# Altium footprint library 6-Connectors-4.PcbLib: 166 footprints (part 8 of 12) (continued)
## SAMTEC_MTLW-105-07-L-D-250 [mm] "10 Contacts - Pitch 2.54mm - Dual Row Through Mount Straight Header (Post Lead = 6.35mm, Tail Lead 3.05mm, Insulator 1.52mm)"
height 7.87
pads (10):
  round 1.7 hole 1: 1(-5.08,-1.27) 2(-5.08,1.27) 3(-2.54,-1.27) 4(-2.54,1.27) 5(0,-1.27) 6(0,1.27) 7(2.54,-1.27) 8(2.54,1.27) 9(5.08,-1.27) 10(5.08,1.27)
Top Overlay:
  circle w0.3: c-5.045,-3.135 r0.15
  lines w0.2: -6.35,-2.007 -6.096,-2.515 -4.064,-2.515 -3.81,-2.007 -3.556,-2.515 -1.524,-2.515 -1.27,-2.007 -1.016,-2.515 1.016,-2.515 1.27,-2.007 1.524,-2.515 3.556,-2.515 3.81,-2.007 4.064,-2.515 6.096,-2.515 6.35,-2.007 6.35,2.007 6.096,2.515 4.064,2.515 3.81,2.007 3.556,2.515 1.524,2.515 1.27,2.007 1.016,2.515 -1.016,2.515 -1.27,2.007 -1.524,2.515 -3.556,2.515 -3.81,2.007 -4.064,2.515 -6.096,2.515 -6.35,2.007 -6.35,-2.007
  text "1" at -7.327,-1.768 h1
Mechanical 8:
  lines w0.1: -5.58,-1.27 -5.08,-1.27 ; -5.58,1.27 -5.08,1.27 ; -5.08,-1.77 -5.08,-1.27 ; -5.08,-0.77 -5.08,-1.27 ; -5.08,0.77 -5.08,1.27 ; -5.08,1.77 -5.08,1.27 ; -4.58,-1.27 -5.08,-1.27 ; -4.58,1.27 -5.08,1.27 ; -3.04,-1.27 -2.54,-1.27 ; -3.04,1.27 -2.54,1.27 ; -2.54,-1.77 -2.54,-1.27 ; -2.54,-0.77 -2.54,-1.27 ; -2.54,0.77 -2.54,1.27 ; -2.54,1.77 -2.54,1.27 ; -2.04,-1.27 -2.54,-1.27 ; -2.04,1.27 -2.54,1.27 ; -0.5,-1.27 0,-1.27 ; -0.5,0 0,0 ; -0.5,1.27 0,1.27 ; 0,-1.77 0,-1.27 ; 0,-0.77 0,-1.27 ; 0,-0.5 0,0 ; 0,0.5 0,0 ; 0,0.77 0,1.27 ; 0,1.77 0,1.27 ; 0.5,-1.27 0,-1.27 ; 0.5,0 0,0 ; 0.5,1.27 0,1.27 ; 2.04,-1.27 2.54,-1.27 ; 2.04,1.27 2.54,1.27 ; 2.54,-1.77 2.54,-1.27 ; 2.54,-0.77 2.54,-1.27 ; 2.54,0.77 2.54,1.27 ; 2.54,1.77 2.54,1.27 ; 3.04,-1.27 2.54,-1.27 ; 3.04,1.27 2.54,1.27 ; 4.58,-1.27 5.08,-1.27 ; 4.58,1.27 5.08,1.27 ; 5.08,-1.77 5.08,-1.27 ; 5.08,-0.77 5.08,-1.27 ; 5.08,0.77 5.08,1.27 ; 5.08,1.77 5.08,1.27 ; 5.58,-1.27 5.08,-1.27 ; 5.58,1.27 5.08,1.27
Mechanical 14:
  circle w0.3: c-5.045,-3.135 r0.15
  lines w0.1: -6.35,-2.007 -6.096,-2.515 -4.064,-2.515 -3.81,-2.007 -3.556,-2.515 -1.524,-2.515 -1.27,-2.007 -1.016,-2.515 1.016,-2.515 1.27,-2.007 1.524,-2.515 3.556,-2.515 3.81,-2.007 4.064,-2.515 6.096,-2.515 6.35,-2.007 6.35,2.007 6.096,2.515 4.064,2.515 3.81,2.007 3.556,2.515 1.524,2.515 1.27,2.007 1.016,2.515 -1.016,2.515 -1.27,2.007 -1.524,2.515 -3.556,2.515 -3.81,2.007 -4.064,2.515 -6.096,2.515 -6.35,2.007 -6.35,-2.007 ; -5.397,-1.587 -4.762,-1.587 -4.762,-0.953 -5.397,-0.953 -5.397,-1.587 ; -5.397,0.953 -4.762,0.953 -4.762,1.587 -5.397,1.587 -5.397,0.953 ; -2.857,-1.587 -2.222,-1.587 -2.222,-0.953 -2.857,-0.953 -2.857,-1.587 ; -2.857,0.953 -2.222,0.953 -2.222,1.587 -2.857,1.587 -2.857,0.953 ; -0.317,-1.587 0.318,-1.587 0.318,-0.953 -0.317,-0.953 -0.317,-1.587 ; -0.317,0.953 0.318,0.953 0.318,1.587 -0.317,1.587 -0.317,0.953 ; 2.223,-1.587 2.858,-1.587 2.858,-0.953 2.223,-0.953 2.223,-1.587 ; 2.223,0.953 2.858,0.953 2.858,1.587 2.223,1.587 2.223,0.953 ; 4.763,-1.587 5.398,-1.587 5.398,-0.953 4.763,-0.953 4.763,-1.587 ; 4.763,0.953 5.398,0.953 5.398,1.587 4.763,1.587 4.763,0.953
  text "1" at -7.327,-1.768 h1
3D body "SAMTEC_MTLW-105-07-L-D-250.stp": height 7.87, standoff -3.05, extent -6.35,-2.515 6.35,2.515

## SAMTEC_MTLW-110-07-L-D-250 [mm] "20 Contacts - Pitch 2.54mm - Dual Row Through Mount Straight Header (Post Lead = 6.35mm, Tail Lead 3.05mm, Insulator 1.52mm)"
height 7.87
pads (20):
  round 1.7 hole 1: 1(-11.43,-1.27) 2(-11.43,1.27) 3(-8.89,-1.27) 4(-8.89,1.27) 5(-6.35,-1.27) 6(-6.35,1.27) 7(-3.81,-1.27) 8(-3.81,1.27) 9(-1.27,-1.27) 10(-1.27,1.27) 11(1.27,-1.27) 12(1.27,1.27) 13(3.81,-1.27) 14(3.81,1.27) 15(6.35,-1.27) 16(6.35,1.27) 17(8.89,-1.27) 18(8.89,1.27) 19(11.43,-1.27) 20(11.43,1.27)
Top Overlay:
  circle w0.3: c-11.395,-3.135 r0.15
  lines w0.2: -10.16,-2.007 -10.414,-2.515 -12.446,-2.515 -12.7,-2.007 -12.7,2.007 -12.446,2.515 -10.414,2.515 -10.16,2.007 ; -10.16,-2.007 -10.16,2.007 ; -10.16,-2.007 -10.16,2.007 ; -10.16,-2.007 -9.906,-2.515 -7.874,-2.515 -7.62,-2.007 ; -10.16,2.007 -9.906,2.515 -7.874,2.515 -7.62,2.007 ; -7.62,-2.007 -7.62,2.007 ; -7.62,-2.007 -7.62,2.007 ; -7.62,-2.007 -7.366,-2.515 -5.334,-2.515 -5.08,-2.007 ; -7.62,2.007 -7.366,2.515 -5.334,2.515 -5.08,2.007 ; -5.08,-2.007 -5.08,2.007 ; -5.08,-2.007 -4.826,-2.515 -2.794,-2.515 -2.54,-2.007 ; -5.08,-2.007 -5.08,2.007 ; -5.08,2.007 -4.826,2.515 -2.794,2.515 -2.54,2.007 ; -2.54,-2.007 -2.54,2.007 ; -2.54,-2.007 -2.286,-2.515 -0.254,-2.515 0,-2.007 ; -2.54,-2.007 -2.54,2.007 ; -2.54,2.007 -2.286,2.515 -0.254,2.515 0,2.007 ; 0,-2.007 0,2.007 ; 0,-2.007 0.254,-2.515 2.286,-2.515 2.54,-2.007 ; 0,-2.007 0,2.007 ; 0,2.007 0.254,2.515 2.286,2.515 2.54,2.007 ; 2.54,-2.007 2.54,2.007 ; 2.54,-2.007 2.54,2.007 ; 2.54,-2.007 2.794,-2.515 4.826,-2.515 5.08,-2.007 ; 2.54,2.007 2.794,2.515 4.826,2.515 5.08,2.007 ; 5.08,-2.007 5.08,2.007 ; 5.08,-2.007 5.08,2.007 ; 5.08,-2.007 5.334,-2.515 7.366,-2.515 7.62,-2.007 ; 5.08,2.007 5.334,2.515 7.366,2.515 7.62,2.007 ; 7.62,-2.007 7.62,2.007 ; 7.62,-2.007 7.874,-2.515 9.906,-2.515 10.16,-2.007 ; 7.62,-2.007 7.62,2.007 ; 7.62,2.007 7.874,2.515 9.906,2.515 10.16,2.007 ; 10.16,-2.007 10.16,2.007 ; 10.16,-2.007 10.414,-2.515 12.446,-2.515 12.7,-2.007 12.7,2.007 12.446,2.515 10.414,2.515 10.16,2.007 ; 10.16,-2.007 10.16,2.007
  text "1" at -13.677,-1.768 h1
Mechanical 8:
  lines w0.1: -11.93,-1.27 -11.43,-1.27 ; -11.93,1.27 -11.43,1.27 ; -11.43,-1.77 -11.43,-1.27 ; -11.43,-0.77 -11.43,-1.27 ; -11.43,0.77 -11.43,1.27 ; -11.43,1.77 -11.43,1.27 ; -10.93,-1.27 -11.43,-1.27 ; -10.93,1.27 -11.43,1.27 ; -9.39,-1.27 -8.89,-1.27 ; -9.39,1.27 -8.89,1.27 ; -8.89,-1.77 -8.89,-1.27 ; -8.89,-0.77 -8.89,-1.27 ; -8.89,0.77 -8.89,1.27 ; -8.89,1.77 -8.89,1.27 ; -8.39,-1.27 -8.89,-1.27 ; -8.39,1.27 -8.89,1.27 ; -6.85,-1.27 -6.35,-1.27 ; -6.85,1.27 -6.35,1.27 ; -6.35,-1.77 -6.35,-1.27 ; -6.35,-0.77 -6.35,-1.27 ; -6.35,0.77 -6.35,1.27 ; -6.35,1.77 -6.35,1.27 ; -5.85,-1.27 -6.35,-1.27 ; -5.85,1.27 -6.35,1.27 ; -4.31,-1.27 -3.81,-1.27 ; -4.31,1.27 -3.81,1.27 ; -3.81,-1.77 -3.81,-1.27 ; -3.81,-0.77 -3.81,-1.27 ; -3.81,0.77 -3.81,1.27 ; -3.81,1.77 -3.81,1.27 ; -3.31,-1.27 -3.81,-1.27 ; -3.31,1.27 -3.81,1.27 ; -1.77,-1.27 -1.27,-1.27 ; -1.77,1.27 -1.27,1.27 ; -1.27,-1.77 -1.27,-1.27 ; -1.27,-0.77 -1.27,-1.27 ; -1.27,0.77 -1.27,1.27 ; -1.27,1.77 -1.27,1.27 ; -0.77,-1.27 -1.27,-1.27 ; -0.77,1.27 -1.27,1.27 ; -0.5,0 0,0 ; 0,-0.5 0,0 ; 0,0.5 0,0 ; 0.5,0 0,0 ; 0.77,-1.27 1.27,-1.27 ; 0.77,1.27 1.27,1.27 ; 1.27,-1.77 1.27,-1.27 ; 1.27,-0.77 1.27,-1.27 ; 1.27,0.77 1.27,1.27 ; 1.27,1.77 1.27,1.27 ; 1.77,-1.27 1.27,-1.27 ; 1.77,1.27 1.27,1.27 ; 3.31,-1.27 3.81,-1.27 ; 3.31,1.27 3.81,1.27 ; 3.81,-1.77 3.81,-1.27 ; 3.81,-0.77 3.81,-1.27 ; 3.81,0.77 3.81,1.27 ; 3.81,1.77 3.81,1.27 ; 4.31,-1.27 3.81,-1.27 ; 4.31,1.27 3.81,1.27 ; 5.85,-1.27 6.35,-1.27 ; 5.85,1.27 6.35,1.27 ; 6.35,-1.77 6.35,-1.27 ; 6.35,-0.77 6.35,-1.27 ; 6.35,0.77 6.35,1.27 ; 6.35,1.77 6.35,1.27 ; 6.85,-1.27 6.35,-1.27 ; 6.85,1.27 6.35,1.27 ; 8.39,-1.27 8.89,-1.27 ; 8.39,1.27 8.89,1.27 ; 8.89,-1.77 8.89,-1.27 ; 8.89,-0.77 8.89,-1.27 ; 8.89,0.77 8.89,1.27 ; 8.89,1.77 8.89,1.27 ; 9.39,-1.27 8.89,-1.27 ; 9.39,1.27 8.89,1.27 ; 10.93,-1.27 11.43,-1.27 ; 10.93,1.27 11.43,1.27 ; 11.43,-1.77 11.43,-1.27 ; 11.43,-0.77 11.43,-1.27 ; 11.43,0.77 11.43,1.27 ; 11.43,1.77 11.43,1.27 ; 11.93,-1.27 11.43,-1.27 ; 11.93,1.27 11.43,1.27
Mechanical 14:
  drawing of 161 lines, arcs and shapes, not listed
  text "1" at -13.677,-1.768 h1
3D body "SAMTEC_MTLW-110-07-L-D-250.stp": height 7.87, standoff -3.05, extent -12.7,-2.515 12.7,2.515

## SAMTEC_PHT-112-01-L-D-024 [mm] "23 Contacts +1 Polarized Position(24) , Pitch 2.54mm - Dual Row, Press-Fit Straigh Header"
height 11.48
pads (23):
  round 1.7 hole 1: 1(-13.97,-1.27) 2(-13.97,1.27) 3(-11.43,-1.27) 4(-11.43,1.27) 5(-8.89,-1.27) 6(-8.89,1.27) 7(-6.35,-1.27) 8(-6.35,1.27) 9(-3.81,-1.27) 10(-3.81,1.27) 11(-1.27,-1.27) 12(-1.27,1.27) 13(1.27,-1.27) 14(1.27,1.27) 15(3.81,-1.27) 16(3.81,1.27) 17(6.35,-1.27) 18(6.35,1.27) 19(8.89,-1.27) 20(8.89,1.27) 21(11.43,-1.27) 22(11.43,1.27) 23(13.97,-1.27)
Top Overlay:
  circle w0.3: c-13.935,-3.135 r0.15
  lines w0.2: -12.827,-2.032 -12.573,-2.032 ; -10.287,-2.032 -10.033,-2.032 ; -10.287,2.032 -10.033,2.032 ; 13.322,0.622 14.618,0.622 ; 13.322,0.622 13.322,1.918 ; 13.322,0.622 13.653,0.953 ; 13.322,1.918 14.618,1.918 ; 13.322,1.918 13.653,1.587 ; 13.653,0.953 14.288,0.953 ; 13.653,0.953 13.653,1.587 ; 13.653,1.587 14.288,1.587 ; 14.288,0.953 14.288,1.587 ; 14.288,0.953 14.618,0.622 ; 14.288,1.587 14.618,1.918 ; 14.618,0.622 14.618,1.918 ; 15.24,-2.515 15.24,2.515 ; 15.24,-2.515 12.954,-2.515 12.954,-2.032 12.446,-2.032 12.446,-2.515 10.414,-2.515 10.414,-2.032 9.906,-2.032 9.906,-2.515 7.874,-2.515 7.874,-2.032 7.366,-2.032 7.366,-2.515 5.334,-2.515 5.334,-2.032 4.826,-2.032 4.826,-2.515 2.794,-2.515 2.794,-2.032 2.286,-2.032 2.286,-2.515 0.254,-2.515 0.254,-2.032 -0.254,-2.032 -0.254,-2.515 -2.286,-2.515 -2.286,-2.032 -2.794,-2.032 -2.794,-2.515 -4.826,-2.515 -4.826,-2.032 -5.334,-2.032 -5.334,-2.515 -7.366,-2.515 -7.366,-2.032 -7.874,-2.032 -7.874,-2.515 -9.906,-2.515 -9.906,-2.032 -10.414,-2.032 -10.414,-2.515 -12.446,-2.515 -12.446,-2.032 -12.954,-2.032 -12.954,-2.515 -15.24,-2.515 -15.24,2.515 -12.954,2.515 -12.954,2.032 -12.446,2.032 -12.446,2.515 -10.414,2.515 -10.414,2.032 -9.906,2.032 -9.906,2.515 -7.874,2.515 -7.874,2.032 -7.366,2.032 -7.366,2.515 -5.334,2.515 -5.334,2.032 -4.826,2.032 -4.826,2.515 -2.794,2.515 -2.794,2.032 -2.286,2.032 -2.286,2.515 -0.254,2.515 -0.254,2.032 0.254,2.032 0.254,2.515 2.286,2.515 2.286,2.032 2.794,2.032 2.794,2.515 4.826,2.515 4.826,2.032 5.334,2.032 5.334,2.515 7.366,2.515 7.366,2.032 7.874,2.032 7.874,2.515 9.906,2.515 9.906,2.032 10.414,2.032 10.414,2.515 12.446,2.515 12.446,2.032 12.954,2.032 12.954,2.515 15.24,2.515 ; 15.24,-2.515 15.24,2.515
  text "1" at -16.217,-1.768 h1
Mechanical 8:
  lines w0.1: -14.47,-1.27 -13.97,-1.27 ; -14.47,1.27 -13.97,1.27 ; -13.97,-1.77 -13.97,-1.27 ; -13.97,-0.77 -13.97,-1.27 ; -13.97,0.77 -13.97,1.27 ; -13.97,1.77 -13.97,1.27 ; -13.47,-1.27 -13.97,-1.27 ; -13.47,1.27 -13.97,1.27 ; -11.93,-1.27 -11.43,-1.27 ; -11.93,1.27 -11.43,1.27 ; -11.43,-1.77 -11.43,-1.27 ; -11.43,-0.77 -11.43,-1.27 ; -11.43,0.77 -11.43,1.27 ; -11.43,1.77 -11.43,1.27 ; -10.93,-1.27 -11.43,-1.27 ; -10.93,1.27 -11.43,1.27 ; -9.39,-1.27 -8.89,-1.27 ; -9.39,1.27 -8.89,1.27 ; -8.89,-1.77 -8.89,-1.27 ; -8.89,-0.77 -8.89,-1.27 ; -8.89,0.77 -8.89,1.27 ; -8.89,1.77 -8.89,1.27 ; -8.39,-1.27 -8.89,-1.27 ; -8.39,1.27 -8.89,1.27 ; -6.85,-1.27 -6.35,-1.27 ; -6.85,1.27 -6.35,1.27 ; -6.35,-1.77 -6.35,-1.27 ; -6.35,-0.77 -6.35,-1.27 ; -6.35,0.77 -6.35,1.27 ; -6.35,1.77 -6.35,1.27 ; -5.85,-1.27 -6.35,-1.27 ; -5.85,1.27 -6.35,1.27 ; -4.31,-1.27 -3.81,-1.27 ; -4.31,1.27 -3.81,1.27 ; -3.81,-1.77 -3.81,-1.27 ; -3.81,-0.77 -3.81,-1.27 ; -3.81,0.77 -3.81,1.27 ; -3.81,1.77 -3.81,1.27 ; -3.31,-1.27 -3.81,-1.27 ; -3.31,1.27 -3.81,1.27 ; -1.77,-1.27 -1.27,-1.27 ; -1.77,1.27 -1.27,1.27 ; -1.27,-1.77 -1.27,-1.27 ; -1.27,-0.77 -1.27,-1.27 ; -1.27,0.77 -1.27,1.27 ; -1.27,1.77 -1.27,1.27 ; -0.77,-1.27 -1.27,-1.27 ; -0.77,1.27 -1.27,1.27 ; -0.5,0 0,0 ; 0,-0.5 0,0 ; 0,0.5 0,0 ; 0.5,0 0,0 ; 0.77,-1.27 1.27,-1.27 ; 0.77,1.27 1.27,1.27 ; 1.27,-1.77 1.27,-1.27 ; 1.27,-0.77 1.27,-1.27 ; 1.27,0.77 1.27,1.27 ; 1.27,1.77 1.27,1.27 ; 1.77,-1.27 1.27,-1.27 ; 1.77,1.27 1.27,1.27 ; 3.31,-1.27 3.81,-1.27 ; 3.31,1.27 3.81,1.27 ; 3.81,-1.77 3.81,-1.27 ; 3.81,-0.77 3.81,-1.27 ; 3.81,0.77 3.81,1.27 ; 3.81,1.77 3.81,1.27 ; 4.31,-1.27 3.81,-1.27 ; 4.31,1.27 3.81,1.27 ; 5.85,-1.27 6.35,-1.27 ; 5.85,1.27 6.35,1.27 ; 6.35,-1.77 6.35,-1.27 ; 6.35,-0.77 6.35,-1.27 ; 6.35,0.77 6.35,1.27 ; 6.35,1.77 6.35,1.27 ; 6.85,-1.27 6.35,-1.27 ; 6.85,1.27 6.35,1.27 ; 8.39,-1.27 8.89,-1.27 ; 8.39,1.27 8.89,1.27 ; 8.89,-1.77 8.89,-1.27 ; 8.89,-0.77 8.89,-1.27 ; 8.89,0.77 8.89,1.27 ; 8.89,1.77 8.89,1.27 ; 9.39,-1.27 8.89,-1.27 ; 9.39,1.27 8.89,1.27 ; 10.93,-1.27 11.43,-1.27 ; 10.93,1.27 11.43,1.27 ; 11.43,-1.77 11.43,-1.27 ; 11.43,-0.77 11.43,-1.27 ; 11.43,0.77 11.43,1.27 ; 11.43,1.77 11.43,1.27 ; 11.93,-1.27 11.43,-1.27 ; 11.93,1.27 11.43,1.27 ; 13.47,-1.27 13.97,-1.27 ; 13.47,1.27 13.97,1.27 ; 13.97,-1.77 13.97,-1.27 ; 13.97,-0.77 13.97,-1.27 ; 13.97,0.77 13.97,1.27 ; 13.97,1.77 13.97,1.27 ; 14.47,-1.27 13.97,-1.27 ; 14.47,1.27 13.97,1.27
Mechanical 14:
  drawing of 380 lines, arcs and shapes, not listed
  text "1" at -16.217,-1.768 h1
Mechanical 15:
  lines w0.05: -20.24,-7.54 20.24,-7.54 20.24,7.54 -20.24,7.54 -20.24,-7.54
  text "4mm Tickness on a Zone of 5mm Around The Connector." at -20.24,-3.775 h1
  text "Do Not Put Any Component With a Height More Than" at -19.6,3.075 h1
Drill Drawing:
  lines w0.1: -15.24,-4.81 -15.24,4.6 15.24,4.6 15.24,-4.81 -15.24,-4.81
  text "PRESS-FIT TECHNOLOGY" at -9.3,3.15 h1
  text "Diam. 1mm +0.09 -0.06" at -9.45,-4.15 h1
3D body "SAMTEC_PHT-112-01-L-D-024.stp": height 8.38, standoff -3.1, extent -15.24,-2.515 15.24,2.515

## SAMTEC_RSM-110-02-L-D-K-TR [mm] "20 Contacts - Pitch 1.27mm - Dual Row Straight SMD Micro Socket"
height 6.1
pads (20):
  rect 0.74x1.84 smd: 1(-5.715,2.825) 2(-5.715,-2.825) 3(-4.445,2.825) 4(-4.445,-2.825) 5(-3.175,2.825) 6(-3.175,-2.825) 7(-1.905,2.825) 8(-1.905,-2.825) 9(-0.635,2.825) 10(-0.635,-2.825) 11(0.635,2.825) 12(0.635,-2.825) 13(1.905,2.825) 14(1.905,-2.825) 15(3.175,2.825) 16(3.175,-2.825) 17(4.445,2.825) 18(4.445,-2.825) 19(5.715,2.825) 20(5.715,-2.825)
Top Overlay:
  circle w0.25: c-6.767,3.811 r0.125
  circle w0.25: c-6.767,3.811 r0.125
Mechanical 8:
  drawing of 214 lines, arcs and shapes, not listed
Mechanical 14:
  drawing of 245 lines, arcs and shapes, not listed
Mechanical 15:
  lines w0.1: -6.727,-3.995 -6.727,3.995 6.727,3.995 6.727,-3.995 -6.727,-3.995
3D body "p184-074.stp": height 0.02, standoff 0, extent -6.085,-3.745 -5.345,-1.905
3D body "p184-074.stp": height 0.02, standoff 0, extent -4.815,-3.745 -4.075,-1.905
3D body "p184-074.stp": height 0.02, standoff 0, extent -3.545,-3.745 -2.805,-1.905
3D body "p184-074.stp": height 0.02, standoff 0, extent -2.275,-3.745 -1.535,-1.905
3D body "p184-074.stp": height 0.02, standoff 0, extent -1.005,-3.745 -0.265,-1.905
3D body "p184-074.stp": height 0.02, standoff 0, extent 0.265,-3.745 1.005,-1.905
3D body "p184-074.stp": height 0.02, standoff 0, extent 1.535,-3.745 2.275,-1.905
3D body "p184-074.stp": height 0.02, standoff 0, extent 2.805,-3.745 3.545,-1.905
3D body "p184-074.stp": height 0.02, standoff 0, extent 4.075,-3.745 4.815,-1.905
3D body "p184-074.stp": height 0.02, standoff 0, extent 5.345,-3.745 6.085,-1.905
3D body "p184-074.stp": height 0.02, standoff 0, extent 5.345,1.905 6.085,3.745
3D body "p184-074.stp": height 0.02, standoff 0, extent 4.075,1.905 4.815,3.745
3D body "p184-074.stp": height 0.02, standoff 0, extent 2.805,1.905 3.545,3.745
3D body "p184-074.stp": height 0.02, standoff 0, extent 1.535,1.905 2.275,3.745
3D body "p184-074.stp": height 0.02, standoff 0, extent 0.265,1.905 1.005,3.745
3D body "p184-074.stp": height 0.02, standoff 0, extent -1.005,1.905 -0.265,3.745
3D body "p184-074.stp": height 0.02, standoff 0, extent -2.275,1.905 -1.535,3.745
3D body "p184-074.stp": height 0.02, standoff 0, extent -3.545,1.905 -2.805,3.745
3D body "p184-074.stp": height 0.02, standoff 0, extent -4.815,1.905 -4.075,3.745
3D body "p184-074.stp": height 0.02, standoff 0, extent -6.085,1.905 -5.345,3.745
3D body "SAMTEC_RSM-110-02-L-D-K-TR.stp": height 6.07, standoff 0, extent -6.477,-3.232 6.477,3.232

## SAMTEC_RSM-120-02-L-D-K-TR [mm] "40 Contacts - Pitch 1.27mm - Dual Row Straight SMD Micro Socket"
height 6.1
pads (40):
  rect 0.74x1.84 smd: 1(-12.065,2.825) 2(-12.065,-2.825) 3(-10.795,2.825) 4(-10.795,-2.825) 5(-9.525,2.825) 6(-9.525,-2.825) 7(-8.255,2.825) 8(-8.255,-2.825) 9(-6.985,2.825) 10(-6.985,-2.825) 11(-5.715,2.825) 12(-5.715,-2.825) 13(-4.445,2.825) 14(-4.445,-2.825) 15(-3.175,2.825) 16(-3.175,-2.825) 17(-1.905,2.825) 18(-1.905,-2.825) 19(-0.635,2.825) 20(-0.635,-2.825) 21(0.635,2.825) 22(0.635,-2.825) 23(1.905,2.825) 24(1.905,-2.825) 25(3.175,2.825) 26(3.175,-2.825) 27(4.445,2.825) 28(4.445,-2.825) 29(5.715,2.825) 30(5.715,-2.825) 31(6.985,2.825) 32(6.985,-2.825) 33(8.255,2.825) 34(8.255,-2.825) 35(9.525,2.825) 36(9.525,-2.825) 37(10.795,2.825) 38(10.795,-2.825) 39(12.065,2.825) 40(12.065,-2.825)
Top Overlay:
  circle w0.25: c-13.117,3.811 r0.125
  circle w0.25: c-13.117,3.811 r0.125
  lines w0.2: -12.827,-2.54 -12.827,2.54 ; 12.827,-2.54 12.827,2.54
Mechanical 8:
  drawing of 324 lines, arcs and shapes, not listed
Mechanical 14:
  drawing of 485 lines, arcs and shapes, not listed
Mechanical 15:
  lines w0.05: -13.077,-3.995 -13.077,3.995 13.077,3.995 13.077,-3.995 -13.077,-3.995
3D body "p184-074.stp": height 0.02, standoff 0, extent -12.435,-3.745 -11.695,-1.905
3D body "p184-074.stp": height 0.02, standoff 0, extent -11.165,-3.745 -10.425,-1.905
3D body "p184-074.stp": height 0.02, standoff 0, extent -9.895,-3.745 -9.155,-1.905
3D body "p184-074.stp": height 0.02, standoff 0, extent -8.625,-3.745 -7.885,-1.905
3D body "p184-074.stp": height 0.02, standoff 0, extent -7.355,-3.745 -6.615,-1.905
3D body "p184-074.stp": height 0.02, standoff 0, extent -6.085,-3.745 -5.345,-1.905
3D body "p184-074.stp": height 0.02, standoff 0, extent -4.815,-3.745 -4.075,-1.905
3D body "p184-074.stp": height 0.02, standoff 0, extent -3.545,-3.745 -2.805,-1.905
3D body "p184-074.stp": height 0.02, standoff 0, extent -2.275,-3.745 -1.535,-1.905
3D body "p184-074.stp": height 0.02, standoff 0, extent -1.005,-3.745 -0.265,-1.905
3D body "p184-074.stp": height 0.02, standoff 0, extent 0.265,-3.745 1.005,-1.905
3D body "p184-074.stp": height 0.02, standoff 0, extent 1.535,-3.745 2.275,-1.905
3D body "p184-074.stp": height 0.02, standoff 0, extent 2.805,-3.745 3.545,-1.905
3D body "p184-074.stp": height 0.02, standoff 0, extent 4.075,-3.745 4.815,-1.905
3D body "p184-074.stp": height 0.02, standoff 0, extent 5.345,-3.745 6.085,-1.905
3D body "p184-074.stp": height 0.02, standoff 0, extent 6.615,-3.745 7.355,-1.905
3D body "p184-074.stp": height 0.02, standoff 0, extent 7.885,-3.745 8.625,-1.905
3D body "p184-074.stp": height 0.02, standoff 0, extent 9.155,-3.745 9.895,-1.905
3D body "p184-074.stp": height 0.02, standoff 0, extent 10.425,-3.745 11.165,-1.905
3D body "p184-074.stp": height 0.02, standoff 0, extent 11.695,-3.745 12.435,-1.905
3D body "p184-074.stp": height 0.02, standoff 0, extent 11.695,1.905 12.435,3.745
3D body "p184-074.stp": height 0.02, standoff 0, extent 10.425,1.905 11.165,3.745
3D body "p184-074.stp": height 0.02, standoff 0, extent 9.155,1.905 9.895,3.745
3D body "p184-074.stp": height 0.02, standoff 0, extent 7.885,1.905 8.625,3.745
3D body "p184-074.stp": height 0.02, standoff 0, extent 6.615,1.905 7.355,3.745
3D body "p184-074.stp": height 0.02, standoff 0, extent 5.345,1.905 6.085,3.745
3D body "p184-074.stp": height 0.02, standoff 0, extent 4.075,1.905 4.815,3.745
3D body "p184-074.stp": height 0.02, standoff 0, extent 2.805,1.905 3.545,3.745
3D body "p184-074.stp": height 0.02, standoff 0, extent 1.535,1.905 2.275,3.745
3D body "p184-074.stp": height 0.02, standoff 0, extent 0.265,1.905 1.005,3.745
3D body "p184-074.stp": height 0.02, standoff 0, extent -1.005,1.905 -0.265,3.745
3D body "p184-074.stp": height 0.02, standoff 0, extent -2.275,1.905 -1.535,3.745
3D body "p184-074.stp": height 0.02, standoff 0, extent -3.545,1.905 -2.805,3.745
3D body "p184-074.stp": height 0.02, standoff 0, extent -4.815,1.905 -4.075,3.745
3D body "p184-074.stp": height 0.02, standoff 0, extent -6.085,1.905 -5.345,3.745
3D body "p184-074.stp": height 0.02, standoff 0, extent -7.355,1.905 -6.615,3.745
3D body "p184-074.stp": height 0.02, standoff 0, extent -8.625,1.905 -7.885,3.745
3D body "p184-074.stp": height 0.02, standoff 0, extent -9.895,1.905 -9.155,3.745
3D body "p184-074.stp": height 0.02, standoff 0, extent -11.165,1.905 -10.425,3.745
3D body "p184-074.stp": height 0.02, standoff 0, extent -12.435,1.905 -11.695,3.745
3D body "SAMTEC_RSM-120-02-L-D-K-TR.stp": height 6.07, standoff 0, extent -12.827,-3.232 12.827,3.232

## SAMTEC_SFM-105-02-S-D-APTR [mm] "10 Contacts - Pitch 1.27mm - Top Entry, Dual Row Surface Mount Receptacle With Alignment Pin"
height 4.75
pads (12):
  rect 0.73x2.2 smd: 1(-2.54,1.365) 2(-2.54,-1.365) 3(-1.27,1.365) 4(-1.27,-1.365) 5(0,1.365) 6(0,-1.365) 7(1.27,1.365) 8(1.27,-1.365) 9(2.54,1.365) 10(2.54,-1.365)
  round 1 hole 1.4 unplated mask+0.2: MEC1(-4.13,0) MEC2(4.13,0)
Top Overlay:
  circle w0.25: c-3.592,2.35 r0.125
  circle w0.25: c-3.592,2.35 r0.125
  lines w0.2: -3.366,-0.564 -3.366,-1.524 -3.31,-1.524 ; -3.366,0.564 -3.366,1.524 -3.31,1.524 ; 3.31,-2.159 3.365,-2.159 3.365,-1.524 ; 3.31,-1.524 3.365,-1.524 ; 3.31,1.524 3.365,1.524 3.365,0.564 ; 3.365,-0.564 3.365,-1.524
Mechanical 8:
  lines w0.1: -4.63,0 -4.13,0 ; -4.13,-0.5 -4.13,0 ; -4.13,0.5 -4.13,0 ; -3.63,0 -4.13,0 ; -3.04,-1.365 -2.54,-1.365 ; -3.04,1.365 -2.54,1.365 ; -2.54,-1.865 -2.54,-1.365 ; -2.54,-0.865 -2.54,-1.365 ; -2.54,0.865 -2.54,1.365 ; -2.54,1.865 -2.54,1.365 ; -2.04,-1.365 -2.54,-1.365 ; -2.04,1.365 -2.54,1.365 ; -1.77,-1.365 -1.27,-1.365 ; -1.77,1.365 -1.27,1.365 ; -1.27,-1.865 -1.27,-1.365 ; -1.27,-0.865 -1.27,-1.365 ; -1.27,0.865 -1.27,1.365 ; -1.27,1.865 -1.27,1.365 ; -0.77,-1.365 -1.27,-1.365 ; -0.77,1.365 -1.27,1.365 ; -0.5,-1.365 0,-1.365 ; -0.5,0 0,0 ; -0.5,1.365 0,1.365 ; 0,-1.865 0,-1.365 ; 0,-0.865 0,-1.365 ; 0,-0.5 0,0 ; 0,0.5 0,0 ; 0,0.865 0,1.365 ; 0,1.865 0,1.365 ; 0.5,-1.365 0,-1.365 ; 0.5,0 0,0 ; 0.5,1.365 0,1.365 ; 0.77,-1.365 1.27,-1.365 ; 0.77,1.365 1.27,1.365 ; 1.27,-1.865 1.27,-1.365 ; 1.27,-0.865 1.27,-1.365 ; 1.27,0.865 1.27,1.365 ; 1.27,1.865 1.27,1.365 ; 1.77,-1.365 1.27,-1.365 ; 1.77,1.365 1.27,1.365 ; 2.04,-1.365 2.54,-1.365 ; 2.04,1.365 2.54,1.365 ; 2.54,-1.865 2.54,-1.365 ; 2.54,-0.865 2.54,-1.365 ; 2.54,0.865 2.54,1.365 ; 2.54,1.865 2.54,1.365 ; 3.04,-1.365 2.54,-1.365 ; 3.04,1.365 2.54,1.365 ; 3.63,0 4.13,0 ; 4.13,-0.5 4.13,0 ; 4.13,0.5 4.13,0 ; 4.63,0 4.13,0 ; -2.91,-2.475 -2.17,-2.475 -2.17,-0.254 -2.91,-0.254 -2.91,-2.475 ; -2.91,0.254 -2.91,2.475 -2.17,2.475 -2.17,0.254 -2.91,0.254 ; -1.64,-2.475 -0.9,-2.475 -0.9,-0.254 -1.64,-0.254 -1.64,-2.475 ; -1.64,0.254 -1.64,2.475 -0.9,2.475 -0.9,0.254 -1.64,0.254 ; -0.37,-2.475 0.37,-2.475 0.37,-0.254 -0.37,-0.254 -0.37,-2.475 ; -0.37,0.254 -0.37,2.475 0.37,2.475 0.37,0.254 -0.37,0.254 ; 0.9,-2.475 1.64,-2.475 1.64,-0.254 0.9,-0.254 0.9,-2.475 ; 0.9,0.254 0.9,2.475 1.64,2.475 1.64,0.254 0.9,0.254 ; 2.17,-2.475 2.91,-2.475 2.91,-0.254 2.17,-0.254 2.17,-2.475 ; 2.17,0.254 2.17,2.475 2.91,2.475 2.91,0.254 2.17,0.254
Mechanical 14:
  lines w0.1: -3.366,-0.635 -4.763,-0.635 -4.763,0.635 -3.366,0.635 ; 1.333,-1.524 1.333,-2.159 3.366,-2.159 3.366,1.524 -3.366,1.524 -3.366,-1.524 3.366,-1.524 ; 3.366,-0.635 4.763,-0.635 4.763,0.635 3.366,0.635 ; -3.048,-1.143 -3.048,-0.127 ; -3.048,-1.143 -2.032,-1.143 ; -3.048,-1.143 -2.819,-0.914 ; -3.048,-0.127 -2.032,-0.127 ; -3.048,-0.127 -2.819,-0.356 ; -3.048,0.127 -3.048,1.143 ; -3.048,0.127 -2.032,0.127 ; -3.048,0.127 -2.819,0.356 ; -3.048,1.143 -2.032,1.143 ; -3.048,1.143 -2.819,0.914 ; -2.819,-0.914 -2.819,-0.356 ; -2.819,-0.914 -2.261,-0.914 ; -2.819,-0.356 -2.261,-0.356 ; -2.819,0.356 -2.819,0.914 ; -2.819,0.356 -2.261,0.356 ; -2.819,0.914 -2.261,0.914 ; -2.261,-0.914 -2.032,-1.143 ; -2.261,-0.914 -2.261,-0.356 ; -2.261,-0.356 -2.032,-0.127 ; -2.261,0.356 -2.032,0.127 ; -2.261,0.356 -2.261,0.914 ; -2.261,0.914 -2.032,1.143 ; -2.032,-1.143 -2.032,-0.127 ; -2.032,0.127 -2.032,1.143 ; -1.778,-1.143 -1.778,-0.127 ; -1.778,-1.143 -0.762,-1.143 ; -1.778,-1.143 -1.549,-0.914 ; -1.778,-0.127 -0.762,-0.127 ; -1.778,-0.127 -1.549,-0.356 ; -1.778,0.127 -1.778,1.143 ; -1.778,0.127 -0.762,0.127 ; -1.778,0.127 -1.549,0.356 ; -1.778,1.143 -0.762,1.143 ; -1.778,1.143 -1.549,0.914 ; -1.549,-0.914 -1.549,-0.356 ; -1.549,-0.914 -0.991,-0.914 ; -1.549,-0.356 -0.991,-0.356 ; -1.549,0.356 -1.549,0.914 ; -1.549,0.356 -0.991,0.356 ; -1.549,0.914 -0.991,0.914 ; -0.991,-0.914 -0.762,-1.143 ; -0.991,-0.914 -0.991,-0.356 ; -0.991,-0.356 -0.762,-0.127 ; -0.991,0.356 -0.762,0.127 ; -0.991,0.356 -0.991,0.914 ; -0.991,0.914 -0.762,1.143 ; -0.762,-1.143 -0.762,-0.127 ; -0.762,0.127 -0.762,1.143 ; -0.508,-1.143 -0.508,-0.127 ; -0.508,-1.143 0.508,-1.143 ; -0.508,-1.143 -0.279,-0.914 ; -0.508,-0.127 0.508,-0.127 ; -0.508,-0.127 -0.279,-0.356 ; -0.508,0.127 -0.508,1.143 ; -0.508,0.127 0.508,0.127 ; -0.508,0.127 -0.279,0.356 ; -0.508,1.143 0.508,1.143 ; -0.508,1.143 -0.279,0.914 ; -0.279,-0.914 -0.279,-0.356 ; -0.279,-0.914 0.279,-0.914 ; -0.279,-0.356 0.279,-0.356 ; -0.279,0.356 -0.279,0.914 ; -0.279,0.356 0.279,0.356 ; -0.279,0.914 0.279,0.914 ; 0.279,-0.914 0.508,-1.143 ; 0.279,-0.914 0.279,-0.356 ; 0.279,-0.356 0.508,-0.127 ; 0.279,0.356 0.508,0.127 ; 0.279,0.356 0.279,0.914 ; 0.279,0.914 0.508,1.143 ; 0.508,-1.143 0.508,-0.127 ; 0.508,0.127 0.508,1.143 ; 0.762,-1.143 0.762,-0.127 ; 0.762,-1.143 1.778,-1.143 ; 0.762,-1.143 0.991,-0.914 ; 0.762,-0.127 1.778,-0.127 ; 0.762,-0.127 0.991,-0.356 ; 0.762,0.127 0.762,1.143 ; 0.762,0.127 1.778,0.127 ; 0.762,0.127 0.991,0.356 ; 0.762,1.143 1.778,1.143 ; 0.762,1.143 0.991,0.914 ; 0.991,-0.914 0.991,-0.356 ; 0.991,-0.914 1.549,-0.914 ; 0.991,-0.356 1.549,-0.356 ; 0.991,0.356 0.991,0.914 ; 0.991,0.356 1.549,0.356 ; 0.991,0.914 1.549,0.914 ; 1.549,-0.914 1.778,-1.143 ; 1.549,-0.914 1.549,-0.356 ; 1.549,-0.356 1.778,-0.127 ; 1.549,0.356 1.778,0.127 ; 1.549,0.356 1.549,0.914 ; 1.549,0.914 1.778,1.143 ; 1.778,-1.143 1.778,-0.127 ; 1.778,0.127 1.778,1.143 ; 2.032,-1.143 2.032,-0.127 ; 2.032,-1.143 3.048,-1.143 ; 2.032,-1.143 2.261,-0.914 ; 2.032,-0.127 3.048,-0.127 ; 2.032,-0.127 2.261,-0.356 ; 2.032,0.127 2.032,1.143 ; 2.032,0.127 3.048,0.127 ; 2.032,0.127 2.261,0.356 ; 2.032,1.143 3.048,1.143 ; 2.032,1.143 2.261,0.914 ; 2.261,-0.914 2.261,-0.356 ; 2.261,-0.914 2.819,-0.914 ; 2.261,-0.356 2.819,-0.356 ; 2.261,0.356 2.261,0.914 ; 2.261,0.356 2.819,0.356 ; 2.261,0.914 2.819,0.914 ; 2.819,-0.914 3.048,-1.143 ; 2.819,-0.914 2.819,-0.356 ; 2.819,-0.356 3.048,-0.127 ; 2.819,0.356 3.048,0.127 ; 2.819,0.356 2.819,0.914 ; 2.819,0.914 3.048,1.143 ; 3.048,-1.143 3.048,-0.127 ; 3.048,0.127 3.048,1.143
Mechanical 15:
  lines w0.05: -5.013,-2.725 -5.013,2.725 5.013,2.725 5.013,-2.725 -5.013,-2.725
3D body "p220-073.stp": height 0.02, standoff 0, extent -2.905,-2.464 -2.175,-0.264
3D body "p220-073.stp": height 0.02, standoff 0, extent -1.635,-2.464 -0.905,-0.264
3D body "p220-073.stp": height 0.02, standoff 0, extent -0.365,-2.464 0.365,-0.264
3D body "p220-073.stp": height 0.02, standoff 0, extent 0.905,-2.464 1.635,-0.264
3D body "p220-073.stp": height 0.02, standoff 0, extent 2.175,-2.464 2.905,-0.264
3D body "p220-073.stp": height 0.02, standoff 0, extent 2.175,0.265 2.905,2.465
3D body "p220-073.stp": height 0.02, standoff 0, extent 0.905,0.265 1.635,2.465
3D body "p220-073.stp": height 0.02, standoff 0, extent -0.365,0.265 0.365,2.465
3D body "p220-073.stp": height 0.02, standoff 0, extent -1.635,0.265 -0.905,2.465
3D body "p220-073.stp": height 0.02, standoff 0, extent -2.905,0.265 -2.175,2.465
3D body "SAMTEC_SFM-105-02-S-D-APTR.stp": height 4.7, standoff -1.14, extent -4.765,-2.159 4.765,2.096